# Altium footprint library Item_pcb.PcbLib: 282 footprints (part 6 of 18)
Each footprint in its own frame and in the unit in brackets; x right, y up, seen from the top. Pads: shape width x height; smd on the part's side, far side on the other; paste and mask are expansions set on the pad; w line width, h text height; cw(c..) or ccw(c..) is an arc to the next point about the centre after c.
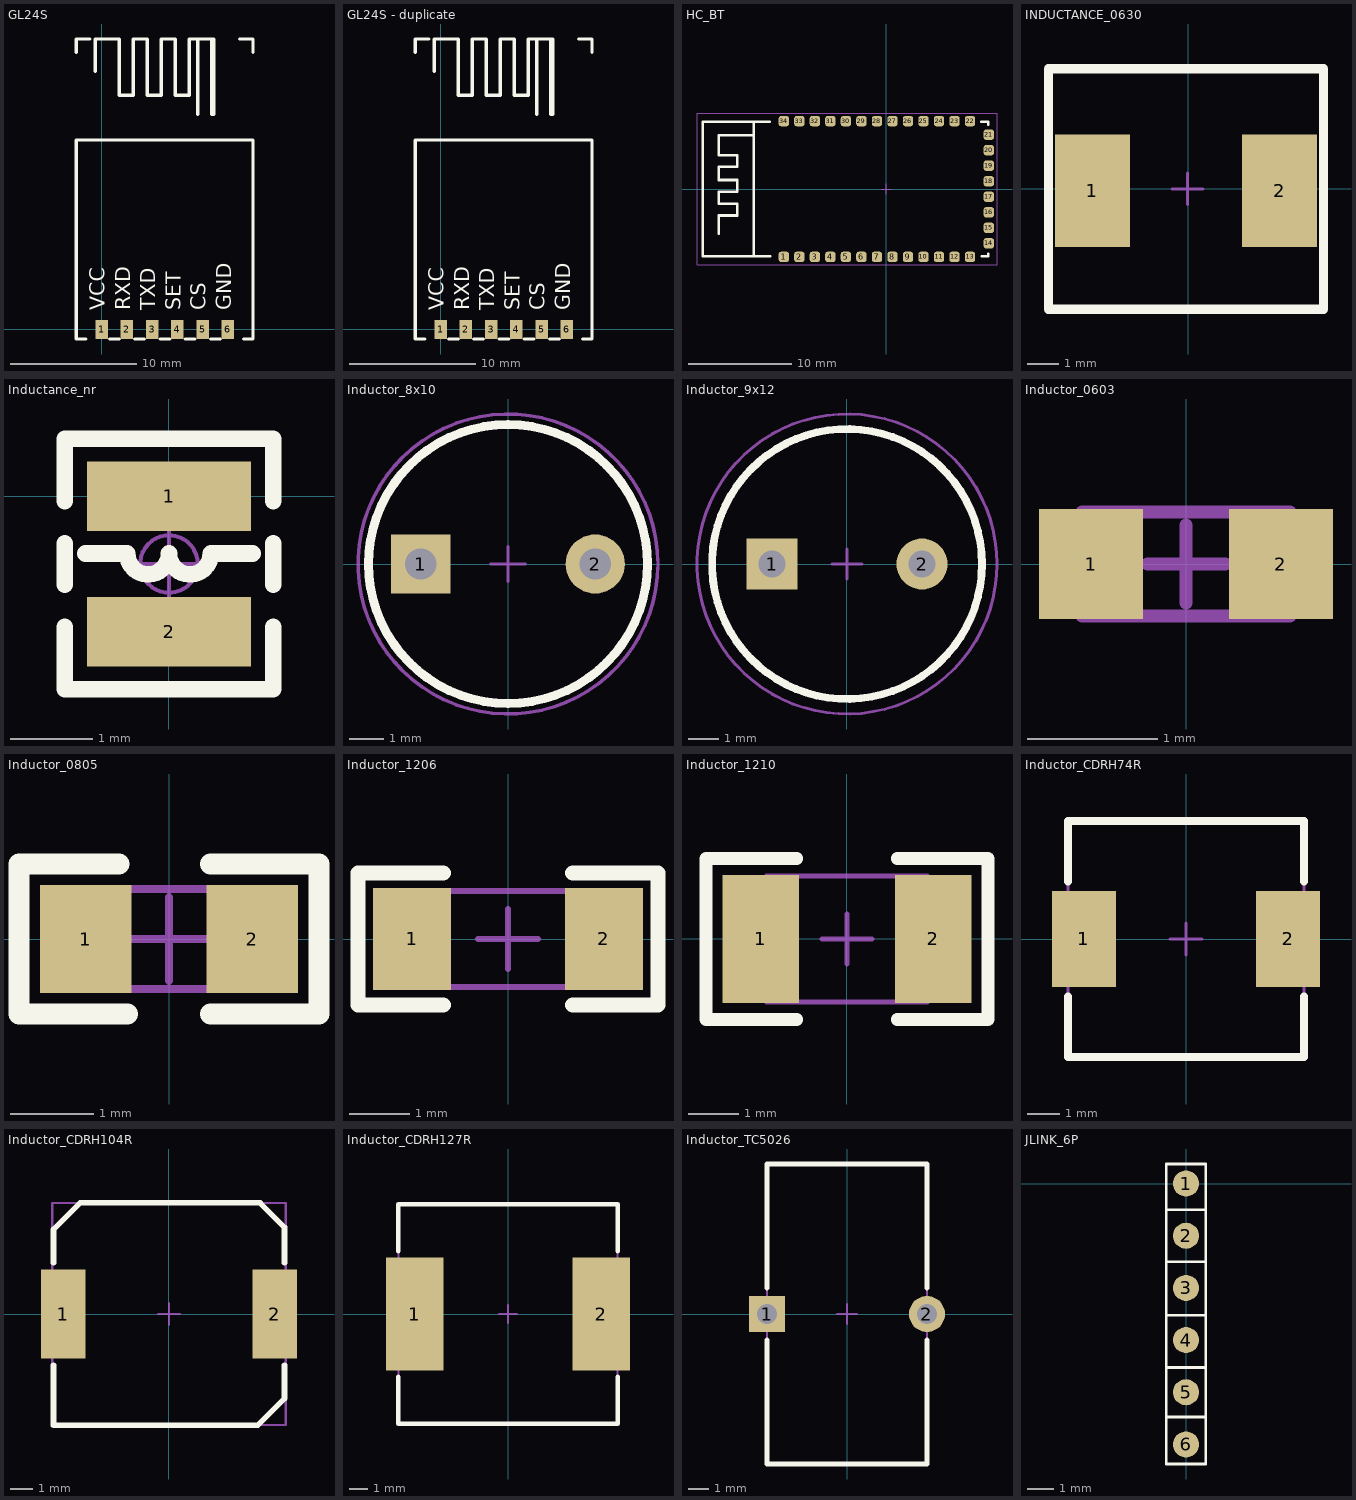
[diagram p5: the footprints below, top view; thin cyan lines are the x and y axes]

## GL24S [mm]
pads (6):
  rect 1x1.5 smd: 1(0,0) 2(2,0) 3(4,0) 4(6,0) 5(8,0) 6(10,0)
Top Overlay:
  lines w0.254: -2,21.922 -2,23 -0.922,23 ; -1.238,-0.762 -2,-0.762 -2,15 12,15 ; -0.508,20.447 -0.508,23 1.397,23 1.397,18.542 2.508,18.542 2.508,23 3.619,23 3.619,18.542 4.73,18.542 4.73,23 5.841,23 5.841,18.542 6.952,18.542 6.952,23 8.877,23 ; 0.635,-0.762 1.397,-0.762 ; 2.635,-0.762 3.397,-0.762 ; 4.635,-0.762 5.397,-0.762 ; 6.635,-0.762 7.397,-0.762 ; 7.62,17.018 7.62,22.987 ; 8.635,-0.762 9.397,-0.762 ; 8.731,22.987 8.731,17.018 8.89,17.018 8.89,22.987 ; 10,15 12,15 ; 10.922,23 12,23 12,21.922 ; 11.238,-0.762 12,-0.762 12,15
  text "VCC" at 0.65,1.524 h2.03
  text "RXD" at 2.667,1.526 h2.03
  text "TXD" at 4.667,1.524 h2.03
  text "SET" at 6.65,1.524 h2.03
  text "CS" at 8.65,1.524 h2.03
  text "GND" at 10.65,1.524 h2.03
3D body: height 1.6, standoff 1, extent -2,15 12,23
3D body: height 1.6, standoff 1, extent -2,-0.762 12,15

## GL24S - duplicate [mm]
pads (6):
  rect 1x1.5 smd: 1(0,0) 2(2,0) 3(4,0) 4(6,0) 5(8,0) 6(10,0)
Top Overlay:
  lines w0.254: -2,21.922 -2,23 -0.922,23 ; -1.238,-0.762 -2,-0.762 -2,15 12,15 ; -0.508,20.447 -0.508,23 1.397,23 1.397,18.542 2.508,18.542 2.508,23 3.619,23 3.619,18.542 4.73,18.542 4.73,23 5.841,23 5.841,18.542 6.952,18.542 6.952,23 8.877,23 ; 0.635,-0.762 1.397,-0.762 ; 2.635,-0.762 3.397,-0.762 ; 4.635,-0.762 5.397,-0.762 ; 6.635,-0.762 7.397,-0.762 ; 7.62,17.018 7.62,22.987 ; 8.635,-0.762 9.397,-0.762 ; 8.731,22.987 8.731,17.018 8.89,17.018 8.89,22.987 ; 10,15 12,15 ; 10.922,23 12,23 12,21.922 ; 11.238,-0.762 12,-0.762 12,15
  text "GND" at 10.65,1.524 h2.03
  text "CS" at 8.65,1.524 h2.03
  text "SET" at 6.65,1.524 h2.03
  text "TXD" at 4.667,1.524 h2.03
  text "RXD" at 2.667,1.526 h2.03
  text "VCC" at 0.65,1.524 h2.03
3D body: height 1.6, standoff 1, extent -2,-0.762 12,15
3D body: height 1.6, standoff 1, extent -2,15 12,23

## HC_BT [mm]
pads (34):
  rrect50% 1x1 smd: 1(-9.906,-6.562) 2(-8.406,-6.562) 3(-6.906,-6.562) 4(-5.406,-6.562) 5(-3.906,-6.562) 6(-2.406,-6.562) 7(-0.906,-6.562) 8(0.594,-6.562) 9(2.094,-6.562) 10(3.594,-6.562) 11(5.094,-6.562) 12(6.594,-6.562) 13(8.094,-6.562) 14(9.906,-5.25) 15(9.906,-3.75) 16(9.906,-2.25) 17(9.906,-0.75) 18(9.906,0.75) 19(9.906,2.25) 20(9.906,3.75) 21(9.906,5.25) 22(8.094,6.562) 23(6.594,6.562) 24(5.094,6.562) 25(3.594,6.562) 26(2.094,6.562) 27(0.594,6.562) 28(-0.906,6.562) 29(-2.406,6.562) 30(-3.906,6.562) 31(-5.406,6.562) 32(-6.906,6.562) 33(-8.406,6.562) 34(-9.906,6.562)
Top Overlay:
  lines w0.254: -16.191,-4.341 -16.191,-2.563 -14.413,-2.563 -14.413,-1.42 -16.191,-1.42 -16.191,-0.277 -14.413,-0.277 -14.413,0.866 -16.191,0.866 -16.191,2.136 -14.413,2.136 -14.413,3.279 -16.191,3.279 -16.191,5.184 -16.181,5.194 -12.899,5.194 ; -12.8,-6.5 -12.8,6.5 ; -11.284,6.5 -17.756,6.5 -17.756,-6.5 -11.238,-6.5 ; 9.163,6.5 9.844,6.5 9.844,6.2 ; 9.209,-6.5 9.844,-6.5 9.844,-6.246
Mechanical 15:
  lines w0.1: -0.5,0 0.5,0 ; 0,-0.5 0,0.5 ; -18.3,-7.3 10.7,-7.3 10.7,7.3 -18.3,7.3 -18.3,-7.3
3D body "HC-06.step": height 2.35, standoff 0, extent -18.11,-7 9.9,7.02

## INDUCTANCE_0630 [mm]
pads (2):
  rect 2.4x3.6 smd: 1(-3.074,-0.052) 2(2.926,-0.052)
Top Overlay:
  lines w0.3: -4.474,-3.852 4.326,-3.852 4.326,3.848 -4.474,3.848 -4.474,-3.852
Mechanical 15:
  lines w0.1: -0.525,0 0.475,0 ; -0.025,-0.5 -0.025,0.5
3D body "Iductor-CDRH-74.step": height 4.5, standoff 0, extent -4.025,-3.7 3.975,3.7

## Inductance_nr [mm]
pads (2):
  rect 2x0.85 smd: 1(0,0) 2(0,-1.65)
Top Overlay:
  lines w0.203: -1.27,-1.587 -1.27,-2.349 1.27,-2.349 1.27,-1.587 ; -1.27,-1.079 -1.27,-0.571 ; -1.27,-0.063 -1.27,0.699 1.27,0.699 1.27,-0.063 ; -1.016,-0.698 -0.508,-0.698 ccw(c-0.254,-0.698) 0,-0.698 ccw(c0.254,-0.698) 0.508,-0.698 1.016,-0.698 ; 1.27,-1.079 1.27,-0.571
Mechanical 15:
  circle w0.05: c0,-0.825 r0.35
  lines w0.05: -0.5,-0.825 0.5,-0.825 ; 0,-1.325 0,-0.325
3D body "NR2520.STEP": height 1.1, standoff 0, extent -1,-2.075 1,0.425

## Inductor_8x10 [mm]
pads (2):
  rect 1.7x1.7 hole 0.9: 1(-2.5,0)
  round 1.7 hole 0.9: 2(2.5,0)
Top Overlay:
  circle w0.254: c0,0 r4
Mechanical 15:
  circle w0.1: c0,0 r4.3
  lines w0.1: -0.5,0 0.5,0 ; 0,-0.5 0,0.5
3D body "CT187.STEP": height 11.2, standoff -5, extent -4.15,-4.15 4.15,4.15

## Inductor_9x12 [mm]
pads (2):
  rect 1.7x1.7 hole 0.9: 1(-2.5,0)
  round 1.7 hole 0.9: 2(2.5,0)
Top Overlay:
  circle w0.254: c0,0 r4.5
Mechanical 15:
  circle w0.1: c0,0 r5
  lines w0.1: -0.5,0 0.5,0 ; 0,-0.5 0,0.5
3D body: height 10, standoff 4, extent -3.984,-4 3.984,3.984
3D body: height 15, standoff 10, extent -4.5,-4.5 4.465,4.482
3D body: height 4, standoff 0, extent -4.5,-4.5 4.465,4.482
3D body: height 3, standoff -1, extent -2.849,-0.35 -2.151,0.349
3D body: height 3, standoff -1, extent 2.15,-0.349 2.847,0.349

## Inductor_0603 [mm]
pads (2):
  rect 0.8x0.85 smd: 1(-0.73,0) 2(0.73,0)
Mechanical 15:
  lines w0.1: -0.297,0 0.303,0 ; 0,-0.3 0,0.3 ; -0.8,-0.4 0.8,-0.4 0.8,0.4 -0.8,0.4 -0.8,-0.4
3D body "INDC1608(0603).STEP": height 0.8, standoff 0, extent -0.8,-0.47 0.8,0.48

## Inductor_0805 [mm]
pads (2):
  rect 1.1x1.3 smd: 1(-1,0) 2(1,0)
Top Overlay:
  lines w0.254: -0.6,0.9 -1.8,0.9 -1.8,-0.9 -0.5,-0.9 ; 0.5,-0.9 1.8,-0.9 1.8,0.9 0.5,0.9
Mechanical 15:
  lines w0.1: -0.5,0 0.5,0 ; 0,-0.5 0,0.5 ; -1,-0.6 -1,0.6 1,0.6 1,-0.6 -1,-0.6
3D body "INDC2012(0805).STEP": height 0.95, standoff 0, extent -1,-0.6 1,0.6

## Inductor_1206 [mm]
pads (2):
  rect 1.3x1.7 smd: 1(-1.6,0) 2(1.6,0)
Top Overlay:
  lines w0.254: -1.079,-1.1 -2.5,-1.1 -2.5,1.1 -1.079,1.1 ; 1.079,-1.1 2.5,-1.1 2.5,1.1 1.079,1.1
Mechanical 15:
  lines w0.1: -0.5,0 0.5,0 ; 0,-0.5 0,0.5 ; -1.6,-0.8 1.6,-0.8 1.6,0.8 -1.6,0.8 -1.6,-0.8
3D body "INDC3216(1206).STEP": height 1.1, standoff 0, extent -1.6,-0.8 1.6,0.8

## Inductor_1210 [mm]
pads (2):
  rect 1.52x2.54 smd: 1(-1.71,0) 2(1.71,0)
Top Overlay:
  lines w0.254: -1,-1.6 -2.8,-1.6 -2.8,1.6 -1,1.6 ; 1,-1.6 2.8,-1.6 2.8,1.6 1,1.6
Mechanical 15:
  lines w0.1: -0.5,0 0.5,0 ; 0,-0.5 0,0.5 ; -1.6,-1.25 -1.6,1.25 1.6,1.25 1.6,-1.25 -1.6,-1.25
3D body "INDC3225(1210).STEP": height 1.35, standoff 0, extent -1.6,-1.25 1.6,1.25

## Inductor_CDRH74R [mm]
pads (2):
  rect 2x3 smd: 1(-3.2,0) 2(3.2,0)
Top Overlay:
  lines w0.254: -3.7,-1.8 -3.7,-3.7 3.7,-3.7 3.7,-1.8 ; -3.7,1.8 -3.7,3.7 3.7,3.7 3.7,1.8
Mechanical 15:
  lines w0.1: -0.5,0 0.5,0 ; 0,-0.5 0,0.5 ; -3.7,-3.7 -3.7,3.7 3.7,3.7 3.7,-3.7 -3.7,-3.7
3D body "Iductor-CDRH-74.step": height 4.5, standoff 0, extent -4,-3.7 4,3.7

## Inductor_CDRH104R [mm]
pads (2):
  rect 2x4 smd: 1(-4.75,0) 2(4.75,0)
Top Overlay:
  lines w0.254: -5.2,-2.3 -5.2,-5 4,-5 5.2,-3.8 5.2,-2.3 ; -5.2,2.3 -5.2,3.8 -4,5 4.1,5 5.2,3.9 5.2,2.3
Mechanical 15:
  lines w0.1: -0.5,0 0.5,0 ; 0,-0.5 0,0.5 ; -5.25,-5 -5.25,5 5.25,5 5.25,-5 -5.25,-5
3D body "Inductor-CDRH104R.STEP": height 4, standoff 0, extent -5.25,-5.15 5.25,5.15

## Inductor_CDRH127R [mm]
pads (2):
  rect 3.2x6.3 smd: 1(-5.2,0) 2(5.2,0)
Top Overlay:
  lines w0.254: -6.1,-3.5 -6.1,-6.1 6.1,-6.1 6.1,-3.5 ; -6.1,3.5 -6.1,6.1 6.1,6.1 6.1,3.5
Mechanical 15:
  lines w0.1: -0.5,0 0.5,0 ; 0,-0.5 0,0.5 ; -6.1,-6.1 -6.1,6.1 6.1,6.1 6.1,-6.1 -6.1,-6.1
3D body "Iductor-CDRH-127.STEP": height 6.8, standoff 0.1, extent -6.25,-6.3 6.25,6.2

## Inductor_TC5026 [mm]
pads (2):
  rect 1.8x1.8 hole 1: 1(-4,0)
  round 1.8 hole 1: 2(4,0)
Top Overlay:
  lines w0.254: -4,-1.3 -4,-7.5 4,-7.5 4,-1.3 ; -4,1.3 -4,7.5 4,7.5 4,1.3
Mechanical 15:
  lines w0.1: -0.5,0 0.5,0 ; 0,-0.5 0,0.5 ; -4,-7.5 -4,7.5 4,7.5 4,-7.5 -4,-7.5
3D body "100uH_2.STEP": height 17.2, standoff -2.18, extent -4,-7.2 4.1,7.2

## JLINK_6P [mm] "2,00MM"
pads (6):
  round 1 smd: 1(0,0) 2(0,-2) 3(0,-4) 4(0,-6) 5(0,-8) 6(0,-10)
Top Overlay:
  lines w0.1: -0.75,-8.95 0.75,-8.95 ; -0.75,-7.05 0.75,-7.05 ; -0.75,-5.05 0.75,-5.05 ; -0.75,-3 0.75,-3 ; -0.75,-1 0.75,-1 ; -0.75,-10.75 0.75,-10.75 0.75,0.75 -0.75,0.75 -0.75,-10.75